# Altium schematic symbol library SCHLIB.SchLib: 2608 symbols (part 10 of 20) (continued)
## R-0R-0402 (continued)
footprint JMP-0402
pins: 1, 2

## R-0R-0402 3 Pad
designator R?, comment 0R  Case Code (Imperial): 0402
RES SMD 0 OHM JUMPER 1/16W 0402; Manufacturer: Royal Electronic Factory; Manufacturer Part Number: 0402WGJ0000TCE; Resistance: 0mR; Max Power Dissipation: 63mW; Power Rating: 62.5mW; Tolerance: 5%; Voltage Rating: 50V; Temperature Coefficient: 200ppm/°C; Washability: OK; ComponentLink1URL: http://www.vishay.com/docs/20035/dcrcwe3.pdf; ComponentLink1Description: http://www.vishay.com/docs/20035/dcrcwe3.pdf; ComponentLink2URL: http://www.farnell.com/datasheets/2111203.pdf; ComponentLink2Description: http://www.farnell.com/datasheets/2111203.pdf; ComponentLink3URL: http://www.farnell.com/datasheets/2045673.pdf; ComponentLink3Description: http://www.farnell.com/datasheets/2045673.pdf; ComponentLink4URL: https://www.distrelec.biz/Web/Downloads/a_/en/flD-CRCW-e3_data_en.pdf?mime=application%2Fpdf; ComponentLink4Description: https://www.distrelec.biz/Web/Downloads/a_/en/flD-CRCW-e3_data_en.pdf?mime=application%2Fpdf; ComponentLink5URL: http://datasheet.octopart.com/CRCW04020000Z0ED-Vishay-datasheet-14722531.pdf; ComponentLink5Description: http://datasheet.octopart.com/CRCW04020000Z0ED-Vishay-datasheet-14722531.pdf; ComponentLink6URL: http://datasheet.octopart.com/CRCW04020000Z0ED-Vishay-datasheet-83961561.pdf; ComponentLink6Description: http://datasheet.octopart.com/CRCW04020000Z0ED-Vishay-datasheet-83961561.pdf; ComponentLink7URL: http://datasheet.octopart.com/CRCW04020000Z0ED-Vishay-datasheet-16179825.pdf; ComponentLink7Description: http://datasheet.octopart.com/CRCW04020000Z0ED-Vishay-datasheet-16179825.pdf; ComponentLink8URL: http://datasheet.octopart.com/CRCW04020000Z0ED-Vishay-datasheet-62317933.pdf; ComponentLink8Description: http://datasheet.octopart.com/CRCW04020000Z0ED-Vishay-datasheet-62317933.pdf; ComponentLink9URL: http://datasheet.octopart.com/CRCW04020000Z0ED-Vishay-datasheet-5300368.pdf; ComponentLink9Description: http://datasheet.octopart.com/CRCW04020000Z0ED-Vishay-datasheet-5300368.pdf; ComponentLink10URL: http://datasheet.octopart.com/CRCW04020000Z0ED-Vishay-datasheet-5306405.pdf; ComponentLink10Description: http://datasheet.octopart.com/CRCW04020000Z0ED-Vishay-datasheet-5306405.pdf; ComponentLink11URL: http://datasheet.octopart.com/CRCW04020000Z0ED-Vishay-datasheet-11516975.pdf; ComponentLink11Description: http://datasheet.octopart.com/CRCW04020000Z0ED-Vishay-datasheet-11516975.pdf; ComponentLink12URL: http://datasheet.octopart.com/CRCW04020000Z0ED-Vishay-datasheet-17599201.pdf; ComponentLink12Description: http://datasheet.octopart.com/CRCW04020000Z0ED-Vishay-datasheet-17599201.pdf; ComponentLink13URL: http://datasheet.octopart.com/CRCW04020000Z0ED-Vishay-datasheet-41302739.pdf; ComponentLink13Description: http://datasheet.octopart.com/CRCW04020000Z0ED-Vishay-datasheet-41302739.pdf; ComponentLink14URL: http://datasheet.octopart.com/CRCW04020000Z0ED-Vishay-datasheet-27121962.pdf; ComponentLink14Description: http://datasheet.octopart.com/CRCW04020000Z0ED-Vishay-datasheet-27121962.pdf; ComponentLink15URL: http://datasheet.octopart.com/CRCW04020000Z0ED-Vishay-datasheet-66077789.pdf; ComponentLink15Description: http://datasheet.octopart.com/CRCW04020000Z0ED-Vishay-datasheet-66077789.pdf; ComponentLink16URL: http://datasheet.octopart.com/CRCW04020000Z0ED-Vishay-datasheet-42367.pdf; ComponentLink16Description: http://datasheet.octopart.com/CRCW04020000Z0ED-Vishay-datasheet-42367.pdf; ComponentLink17URL: http://datasheet.octopart.com/CRCW04020000Z0ED-Vishay-datasheet-148188.pdf; ComponentLink17Description: http://datasheet.octopart.com/CRCW04020000Z0ED-Vishay-datasheet-148188.pdf; ComponentLink18URL: http://datasheet.octopart.com/CRCW04020000Z0ED-Vishay-datasheet-5377255.pdf; ComponentLink18Description: http://datasheet.octopart.com/CRCW04020000Z0ED-Vishay-datasheet-5377255.pdf; ComponentLink19URL: http://datasheet.octopart.com/CRCW04020000Z0ED-Vishay-datasheet-8619608.pdf; ComponentLink19Description: http://datasheet.octopart.com/CRCW04020000Z0ED-Vishay-datasheet-8619608.pdf; ComponentLink20URL: http://datasheet.octopart.com/CRCW04020000Z0ED-Vishay-datasheet-11540273.pdf; ComponentLink20Description: http://datasheet.octopart.com/CRCW04020000Z0ED-Vishay-datasheet-11540273.pdf; ComponentLink21URL: http://datasheet.octopart.com/CRCW04020000Z0ED-Vishay-datasheet-12001583.pdf; ComponentLink21Description: http://datasheet.octopart.com/CRCW04020000Z0ED-Vishay-datasheet-12001583.pdf; ComponentLink22URL: http://datasheet.octopart.com/CRCW04020000Z0ED-Vishay-datasheet-546287.pdf; ComponentLink22Description: http://datasheet.octopart.com/CRCW04020000Z0ED-Vishay-datasheet-546287.pdf; ComponentLink23URL: http://datasheet.octopart.com/CRCW04020000Z0ED-Vishay-datasheet-8361388.pdf; ComponentLink23Description: http://datasheet.octopart.com/CRCW04020000Z0ED-Vishay-datasheet-8361388.pdf; ComponentLink24URL: http://datasheet.octopart.com/CRCW04020000Z0ED-Vishay-datasheet-8788789.pdf; ComponentLink24Description: http://datasheet.octopart.com/CRCW04020000Z0ED-Vishay-datasheet-8788789.pdf; ComponentLink25URL: http://datasheet.octopart.com/CRCW04020000Z0ED-Vishay-datasheet-10322335.pdf; ComponentLink25Description: http://datasheet.octopart.com/CRCW04020000Z0ED-Vishay-datasheet-10322335.pdf; ComponentLink26URL: http://datasheet.octopart.com/CRCW04020000Z0ED-Vishay-datasheet-12509762.pdf; ComponentLink26Description: http://datasheet.octopart.com/CRCW04020000Z0ED-Vishay-datasheet-12509762.pdf; ComponentLink27URL: http://datasheet.octopart.com/CRCW04020000Z0ED-Vishay-datasheet-12517896.pdf; ComponentLink27Description: http://datasheet.octopart.com/CRCW04020000Z0ED-Vishay-datasheet-12517896.pdf; ComponentLink28URL: http://datasheet.octopart.com/CRCW04020000Z0ED-Vishay-datasheet-12532161.pdf; ComponentLink28Description: http://datasheet.octopart.com/CRCW04020000Z0ED-Vishay-datasheet-12532161.pdf; ComponentLink29URL: http://datasheet.octopart.com/CRCW04020000Z0ED-Vishay-datasheet-12600034.pdf; ComponentLink29Description: http://datasheet.octopart.com/CRCW04020000Z0ED-Vishay-datasheet-12600034.pdf; ComponentLink30URL: http://datasheet.octopart.com/CRCW04020000Z0ED-Vishay-datasheet-13034211.pdf; ComponentLink30Description: http://datasheet.octopart.com/CRCW04020000Z0ED-Vishay-datasheet-13034211.pdf; ComponentLink31URL: http://datasheet.octopart.com/CRCW04020000Z0ED-Vishay-datasheet-13195083.pdf; ComponentLink31Description: http://datasheet.octopart.com/CRCW04020000Z0ED-Vishay-datasheet-13195083.pdf; ComponentLink32URL: http://datasheet.octopart.com/CRCW04020000Z0ED-Vishay-datasheet-13242068.pdf; ComponentLink32Description: http://datasheet.octopart.com/CRCW04020000Z0ED-Vishay-datasheet-13242068.pdf; ComponentLink33URL: http://datasheet.octopart.com/CRCW04020000Z0ED-Vishay-datasheet-14190200.pdf; ComponentLink33Description: http://datasheet.octopart.com/CRCW04020000Z0ED-Vishay-datasheet-14190200.pdf; ComponentLink34URL: http://datasheet.octopart.com/CRCW04020000Z0ED-Vishay-Dale-datasheet-38056517.pdf; ComponentLink34Description: http://datasheet.octopart.com/CRCW04020000Z0ED-Vishay-Dale-datasheet-38056517.pdf; ComponentLink35URL: http://datasheet.octopart.com/CRCW04020000Z0ED-Vishay-Dale-datasheet-47688880.pdf; ComponentLink35Description: http://datasheet.octopart.com/CRCW04020000Z0ED-Vishay-Dale-datasheet-47688880.pdf; ComponentLink36URL: http://datasheet.octopart.com/D-CRCW-e3-Standard-Thick-Film-Chip-Resistors-Vishay-datasheet-family-64.pdf; ComponentLink36Description: http://datasheet.octopart.com/D-CRCW-e3-Standard-Thick-Film-Chip-Resistors-Vishay-datasheet-family-64.pdf; Stock 1: 3532500; Pricing 1: 100=0.0089, 1000=0.0025, 10000=0.0013, 50000=0.00115, 250000=0.00105 (USD); Stock 2: 29923308; Pricing 2: 1=0.1, 10=0.014, 25=0.01, 50=0.0078, 100=0.0057, 250=0.00436, 500=0.00348, 1000=0.00257, 5000=0.00184 (USD); Case/Package: 0402; Case Code (Metric): 1005; Contact Plating: Matte,Tin; Min Operating Temperature: -55°C; Max Operating Temperature: 155°C; Packaging: Tape and Reel; Composition: Thick Film; Package Quantity: 1; Number of Terminations: 2; Termination: SMD/SMT; Features: Moisture Resistant; Military Standard: Not; Length: 1mm; Height: 0.016inch; Width: 0.02inch; Depth: 0.5mm; Radiation Hardening: No; Lead Free: Lead Free; REACH SVHC: Unknown; ComponentLink37URL: http://www.yageo.com/documents/recent/PYu-RC_Group_51_RoHS_L_9.pdf; ComponentLink37Description: http://www.yageo.com/documents/recent/PYu-RC_Group_51_RoHS_L_9.pdf; ComponentLink38URL: http://www.yageo.com/documents/recent/PYu-RC0402_51_RoHS_L_6.pdf; ComponentLink38Description: http://www.yageo.com/documents/recent/PYu-RC0402_51_RoHS_L_6.pdf; ComponentLink39URL: http://www.farnell.com/datasheets/1018594.pdf; ComponentLink39Description: http://www.farnell.com/datasheets/1018594.pdf; ComponentLink40URL: https://www.verical.com/server-webapp/html/getDatasheet?partID=326379; ComponentLink40Description: https://www.verical.com/server-webapp/html/getDatasheet?partID=326379; ComponentLink41URL: http://www.farnell.com/datasheets/2167052.pdf; ComponentLink41Description: http://www.farnell.com/datasheets/2167052.pdf; Mount: Surface Mount; Weight: 2.3E-05oz; Voltage Rating (DC): 50V; Stock 3: 70631880; Pricing 3: 1=0.1, 10=0.03, 25=0.0216, 50=0.0164, 100=0.0121, 250=0.00924, 500=0.0074, 1000=0.00545, 5000=0.00391 (USD); ComponentLink42URL: http://industrial.panasonic.com/www-data/pdf/AOA0000/AOA0000CE1.pdf; ComponentLink42Description: http://industrial.panasonic.com/www-data/pdf/AOA0000/AOA0000CE1.pdf; ComponentLink43URL: http://www.alliedelec.com/m/d/51cd0790071e1666bdb9d00c57fcf960.pdf; ComponentLink43Description: http://www.alliedelec.com/m/d/51cd0790071e1666bdb9d00c57fcf960.pdf; ComponentLink44URL: http://www.farnell.com/datasheets/2059623.pdf; ComponentLink44Description: http://www.farnell.com/datasheets/2059623.pdf; ComponentLink45URL: http://www.farnell.com/datasheets/1678796.pdf; ComponentLink45Description: http://www.farnell.com/datasheets/1678796.pdf; Supplier 1: Digi-Key; Supplier Part Number 1: 311-0.0JRDKR-ND
footprint R-0402 - 3 Pad
pins: 1, 2, 3

## R-0R-0603
designator R?, comment 0R  Case Code (Imperial): 0603
RES SMD 0 OHM 1/10W JUMP 0603; Manufacturer: Yageo; Manufacturer Part Number: RC0603JR-070RL; Resistance: 0mR; Tolerance: 1%; Power Rating: 100mW; Voltage Rating (DC): 50V; Temperature Coefficient: 200ppm/°C; Current Rating: 1A; Working Voltage: 75V; Washability: OK; Stock 1: 54397731; Pricing 1: 1=0.1, 10=0.021, 25=0.0152, 50=0.0114, 100=0.0084, 250=0.00644, 500=0.00514, 1000=0.00379 (USD); Case/Package: 0603; Number of Pins: 2; Contact Plating: Matte,Tin; Case Code (Metric): 1608; Min Operating Temperature: -55°C; Max Operating Temperature: 155°C; Composition: Thick Film; Packaging: Tape and Reel; Termination: SMD/SMT; Package Quantity: 5000; Voltage Rating: 50V; Military Standard: Not; Length: 1.6mm; Height: 0.45mm; Width: 0.8mm; Depth: 0.8mm; Radiation Hardening: No; REACH SVHC: No SVHC; Lead Free: Lead Free; ComponentLink1URL: http://www.farnell.com/datasheets/1738695.pdf; ComponentLink1Description: http://www.farnell.com/datasheets/1738695.pdf; ComponentLink2URL: https://www.verical.com/server-webapp/html/getDatasheet?partID=329462; ComponentLink2Description: https://www.verical.com/server-webapp/html/getDatasheet?partID=329462; ComponentLink3URL: http://www.yageo.com/documents/recent/PYu-RC_Group_51_RoHS_L_9.pdf; ComponentLink3Description: http://www.yageo.com/documents/recent/PYu-RC_Group_51_RoHS_L_9.pdf; ComponentLink4URL: http://www.farnell.com/datasheets/443971.pdf; ComponentLink4Description: http://www.farnell.com/datasheets/443971.pdf; ComponentLink5URL: http://documents.rs-components.com/techlib://itc_doclist_GB.htm?stockno=6515918; ComponentLink5Description: http://documents.rs-components.com/techlib://itc_doclist_GB.htm?stockno=6515918; Stock 2: 6104331; Pricing 2: 1=0.1, 10=0.021, 25=0.0152, 50=0.0114, 100=0.0084, 250=0.00644, 500=0.00514, 1000=0.00379 (USD); Number of Terminations: 2; Max Power Dissipation: 100mW; Features: Moisture Resistant; ComponentLink6URL: http://www.farnell.com/datasheets/1868787.pdf; ComponentLink6Description: http://www.farnell.com/datasheets/1868787.pdf; ComponentLink7URL: http://documents.rs-components.com/techlib://itc_doclist_GB.htm?stockno=5048827; ComponentLink7Description: http://documents.rs-components.com/techlib://itc_doclist_GB.htm?stockno=5048827; Stock 3: 34178498; Pricing 3: 1=0.1, 10=0.042, 25=0.0304, 50=0.0232, 100=0.0171, 250=0.01308, 500=0.01046, 1000=0.0077 (USD); Mount: Surface Mount; ComponentLink8URL: http://industrial.panasonic.com/www-data/pdf/AOA0000/AOA0000CE1.pdf; ComponentLink8Description: http://industrial.panasonic.com/www-data/pdf/AOA0000/AOA0000CE1.pdf; ComponentLink9URL: http://www.farnell.com/datasheets/2059623.pdf; ComponentLink9Description: http://www.farnell.com/datasheets/2059623.pdf; ComponentLink10URL: http://www.jameco.com/Jameco/Products/ProdDS/1935748.pdf; ComponentLink10Description: http://www.jameco.com/Jameco/Products/ProdDS/1935748.pdf; ComponentLink11URL: http://www.farnell.com/datasheets/1678796.pdf; ComponentLink11Description: http://www.farnell.com/datasheets/1678796.pdf; ComponentLink12URL: http://www.alliedelec.com/m/d/51cd0790071e1666bdb9d00c57fcf960.pdf; ComponentLink12Description: http://www.alliedelec.com/m/d/51cd0790071e1666bdb9d00c57fcf960.pdf; Supplier 1: Digi-Key; Supplier Part Number 1: 311-0.0HRDKR-ND
footprint JMP-0603
pins: 1, 2

## R-0R-0603 3 Pad
designator R?, comment 0R  Case Code (Imperial): 0603
RES SMD 0 OHM 1/10W JUMP 0603; Manufacturer: Yageo; Manufacturer Part Number: RC0603JR-070RL; Resistance: 0mR; Tolerance: 1%; Power Rating: 100mW; Voltage Rating (DC): 50V; Temperature Coefficient: 200ppm/°C; Current Rating: 1A; Working Voltage: 75V; Washability: OK; Stock 1: 54397731; Pricing 1: 1=0.1, 10=0.021, 25=0.0152, 50=0.0114, 100=0.0084, 250=0.00644, 500=0.00514, 1000=0.00379 (USD); Case/Package: 0603; Number of Pins: 2; Contact Plating: Matte,Tin; Case Code (Metric): 1608; Min Operating Temperature: -55°C; Max Operating Temperature: 155°C; Composition: Thick Film; Packaging: Tape and Reel; Termination: SMD/SMT; Package Quantity: 5000; Voltage Rating: 50V; Military Standard: Not; Length: 1.6mm; Height: 0.45mm; Width: 0.8mm; Depth: 0.8mm; Radiation Hardening: No; REACH SVHC: No SVHC; Lead Free: Lead Free; ComponentLink1URL: http://www.farnell.com/datasheets/1738695.pdf; ComponentLink1Description: http://www.farnell.com/datasheets/1738695.pdf; ComponentLink2URL: https://www.verical.com/server-webapp/html/getDatasheet?partID=329462; ComponentLink2Description: https://www.verical.com/server-webapp/html/getDatasheet?partID=329462; ComponentLink3URL: http://www.yageo.com/documents/recent/PYu-RC_Group_51_RoHS_L_9.pdf; ComponentLink3Description: http://www.yageo.com/documents/recent/PYu-RC_Group_51_RoHS_L_9.pdf; ComponentLink4URL: http://www.farnell.com/datasheets/443971.pdf; ComponentLink4Description: http://www.farnell.com/datasheets/443971.pdf; ComponentLink5URL: http://documents.rs-components.com/techlib://itc_doclist_GB.htm?stockno=6515918; ComponentLink5Description: http://documents.rs-components.com/techlib://itc_doclist_GB.htm?stockno=6515918; Stock 2: 6104331; Pricing 2: 1=0.1, 10=0.021, 25=0.0152, 50=0.0114, 100=0.0084, 250=0.00644, 500=0.00514, 1000=0.00379 (USD); Number of Terminations: 2; Max Power Dissipation: 100mW; Features: Moisture Resistant; ComponentLink6URL: http://www.farnell.com/datasheets/1868787.pdf; ComponentLink6Description: http://www.farnell.com/datasheets/1868787.pdf; ComponentLink7URL: http://documents.rs-components.com/techlib://itc_doclist_GB.htm?stockno=5048827; ComponentLink7Description: http://documents.rs-components.com/techlib://itc_doclist_GB.htm?stockno=5048827; Stock 3: 34178498; Pricing 3: 1=0.1, 10=0.042, 25=0.0304, 50=0.0232, 100=0.0171, 250=0.01308, 500=0.01046, 1000=0.0077 (USD); Mount: Surface Mount; ComponentLink8URL: http://industrial.panasonic.com/www-data/pdf/AOA0000/AOA0000CE1.pdf; ComponentLink8Description: http://industrial.panasonic.com/www-data/pdf/AOA0000/AOA0000CE1.pdf; ComponentLink9URL: http://www.farnell.com/datasheets/2059623.pdf; ComponentLink9Description: http://www.farnell.com/datasheets/2059623.pdf; ComponentLink10URL: http://www.jameco.com/Jameco/Products/ProdDS/1935748.pdf; ComponentLink10Description: http://www.jameco.com/Jameco/Products/ProdDS/1935748.pdf; ComponentLink11URL: http://www.farnell.com/datasheets/1678796.pdf; ComponentLink11Description: http://www.farnell.com/datasheets/1678796.pdf; ComponentLink12URL: http://www.alliedelec.com/m/d/51cd0790071e1666bdb9d00c57fcf960.pdf; ComponentLink12Description: http://www.alliedelec.com/m/d/51cd0790071e1666bdb9d00c57fcf960.pdf; Supplier 1: Digi-Key; Supplier Part Number 1: 311-0.0HRDKR-ND
footprint R-0603 - 3 Pad
pins: 1, 2, 3

## R-1.1K-0402
designator R?, comment Package: 0402  (hidden comment: 1.1K)
RES 1.1K OHM 1% 1/16W 0402; Manufacturer Part Number: RC0402FR-071K1L; Manufacturer: YAGEO; Tolerance: 0.01; Power: 0.063W; Temperature Coefficient: ±100ppm/°C; Object  Type: Part; Design Item ID: R-1.1K-0402; Value: 1.1K; Composition: Thick Film; Features: Moisture Resistant; Operating Temperature: -55°C ~ 155°C; Height - Seated (Max): 0.40mm; Category: Resistor
footprint R0402
pins: 1, 2

## R-1.1K-0603
designator R?, comment Package: 0603  (hidden comment: 1.1K)
RES SMD 1.1K OHM 1% 1/10W 0603; Manufacturer Part Number: CRCW06031K10FKEA; Manufacturer: Vishay Dale; Tolerance: 0.01; Power: 0.1W; Temperature Coefficient: ±100ppm/°C; Object  Type: Part; Design Item ID: R-1.1K-0603; Value: 1.1K; Composition: Thick Film; Features: Automotive AEC-Q200; Operating Temperature: -55°C ~ 155°C; Height - Seated (Max): 0.50mm; Category: Resistor
footprint R0603
pins: 1, 2

## R-1.1M-0402
designator R?, comment Package: 0402  (hidden comment: 1.1M)
RES 1.1M OHM 1% 1/16W 0402; Manufacturer Part Number: RC0402FR-071M1L; Manufacturer: YAGEO; Tolerance: 0.01; Power: 0.063W; Temperature Coefficient: ±100ppm/°C; Object  Type: Part; Design Item ID: R-1.1M-0402; Value: 1.1M; Composition: Thick Film; Features: Moisture Resistant; Operating Temperature: -55°C ~ 155°C; Height - Seated (Max): 0.40mm; Category: Resistor
footprint R0402
pins: 1, 2

## R-1.1M-0603
designator R?, comment Package: 0603  (hidden comment: 1.1M)
RES SMD 1.1M OHM 1% 1/10W 0603; Manufacturer Part Number: CRCW06031M10FKEA; Manufacturer: Vishay Dale; Tolerance: 0.01; Power: 0.1W; Temperature Coefficient: ±100ppm/°C; Object  Type: Part; Design Item ID: R-1.1M-0603; Value: 1.1M; Composition: Thick Film; Features: Automotive AEC-Q200; Operating Temperature: -55°C ~ 155°C; Height - Seated (Max): 0.50mm; Category: Resistor
footprint R0603
pins: 1, 2

## R-1.1R-0603
designator R?, comment Package: 0603  (hidden comment: 1.1R)
RES SMD 1.1 OHM 1% 1/10W 0603; Manufacturer Part Number: CRCW06031R10FKEA; Manufacturer: Vishay Dale; Tolerance: 0.01; Power: 0.1W; Temperature Coefficient: ±100ppm/°C; Object  Type: Part; Design Item ID: R-1.1R-0603; Value: 1.1R; Composition: Thick Film; Features: Automotive AEC-Q200; Operating Temperature: -55°C ~ 155°C; Height - Seated (Max): 0.50mm; Category: Resistor
footprint R0603
pins: 1, 2

## R-1.02K-0402
designator R?, comment Package: 0402  (hidden comment: 1.02K)
RES 1.02K OHM 1% 1/16W 0402; Manufacturer Part Number: RC0402FR-071K02L; Manufacturer: YAGEO; Tolerance: 0.01; Power: 0.063W; Temperature Coefficient: ±100ppm/°C; Object  Type: Part; Design Item ID: R-1.02K-0402; Value: 1.02K; Composition: Thick Film; Features: Moisture Resistant; Operating Temperature: -55°C ~ 155°C; Height - Seated (Max): 0.40mm; Category: Resistor
footprint R0402
pins: 1, 2

## R-1.2K-0402
designator R?, comment Package: 0402  (hidden comment: 1.2K)
RES 1.2K OHM 1% 1/16W 0402; Manufacturer Part Number: RC0402FR-071K2L; Manufacturer: YAGEO; Tolerance: 0.01; Power: 0.063W; Temperature Coefficient: ±100ppm/°C; Object  Type: Part; Design Item ID: R-1.2K-0402; Value: 1.2K; Composition: Thick Film; Features: Moisture Resistant; Operating Temperature: -55°C ~ 155°C; Height - Seated (Max): 0.40mm; Category: Resistor
footprint R0402
pins: 1, 2

## R-1.02K-0603
designator R?, comment Package: 0603  (hidden comment: 1.02K)
RES SMD 1.02K OHM 1% 1/10W 0603; Manufacturer Part Number: CRCW06031K02FKEA; Manufacturer: Vishay Dale; Tolerance: 0.01; Power: 0.1W; Temperature Coefficient: ±100ppm/°C; Object  Type: Part; Design Item ID: R-1.02K-0603; Value: 1.02K; Composition: Thick Film; Features: Automotive AEC-Q200; Operating Temperature: -55°C ~ 155°C; Height - Seated (Max): 0.50mm; Category: Resistor
footprint R0603
pins: 1, 2

## R-1.2K-0603
designator R?, comment Package: 0603  (hidden comment: 1.2K)
RES SMD 1.2K OHM 1% 1/10W 0603; Manufacturer Part Number: CRCW06031K20FKEA; Manufacturer: Vishay Dale; Tolerance: 0.01; Power: 0.1W; Temperature Coefficient: ±100ppm/°C; Object  Type: Part; Design Item ID: R-1.2K-0603; Value: 1.2K; Composition: Thick Film; Features: Automotive AEC-Q200; Operating Temperature: -55°C ~ 155°C; Height - Seated (Max): 0.50mm; Category: Resistor
footprint R0603
pins: 1, 2

## R-1.02M-0402
designator R?, comment Package: 0402  (hidden comment: 1.02M)
RES 1.02M OHM 1% 1/16W 0402; Manufacturer Part Number: RC0402FR-071M02L; Manufacturer: YAGEO; Tolerance: 0.01; Power: 0.063W; Temperature Coefficient: ±100ppm/°C; Object  Type: Part; Design Item ID: R-1.02M-0402; Value: 1.02M; Composition: Thick Film; Features: Moisture Resistant; Operating Temperature: -55°C ~ 155°C; Height - Seated (Max): 0.40mm; Category: Resistor
footprint R0402
pins: 1, 2

## R-1.2M-0402
designator R?, comment Package: 0402  (hidden comment: 1.2M)
RES 1.2M OHM 1% 1/16W 0402; Manufacturer Part Number: RC0402FR-071M2L; Manufacturer: YAGEO; Tolerance: 0.01; Power: 0.063W; Temperature Coefficient: ±100ppm/°C; Object  Type: Part; Design Item ID: R-1.2M-0402; Value: 1.2M; Composition: Thick Film; Features: Moisture Resistant; Operating Temperature: -55°C ~ 155°C; Height - Seated (Max): 0.40mm; Category: Resistor
footprint R0402
pins: 1, 2

## R-1.02M-0603
designator R?, comment Package: 0603  (hidden comment: 1.02M)
RES SMD 1.02M OHM 1% 1/10W 0603; Manufacturer Part Number: CRCW06031M02FKEA; Manufacturer: Vishay Dale; Tolerance: 0.01; Power: 0.1W; Temperature Coefficient: ±100ppm/°C; Object  Type: Part; Design Item ID: R-1.02M-0603; Value: 1.02M; Composition: Thick Film; Features: Automotive AEC-Q200; Operating Temperature: -55°C ~ 155°C; Height - Seated (Max): 0.50mm; Category: Resistor
footprint R0603
pins: 1, 2

## R-1.2M-0603
designator R?, comment Package: 0603  (hidden comment: 1.2M)
RES SMD 1.2M OHM 1% 1/10W 0603; Manufacturer Part Number: CRCW06031M20FKEA; Manufacturer: Vishay Dale; Tolerance: 0.01; Power: 0.1W; Temperature Coefficient: ±100ppm/°C; Object  Type: Part; Design Item ID: R-1.2M-0603; Value: 1.2M; Composition: Thick Film; Features: Automotive AEC-Q200; Operating Temperature: -55°C ~ 155°C; Height - Seated (Max): 0.50mm; Category: Resistor
footprint R0603
pins: 1, 2

## R-1.02R-0603
designator R?, comment Package: 0603  (hidden comment: 1.02R)
RES SMD 1.02 OHM 1% 1/10W 0603; Manufacturer Part Number: CRCW06031R02FKEA; Manufacturer: Vishay Dale; Tolerance: 0.01; Power: 0.1W; Temperature Coefficient: ±100ppm/°C; Object  Type: Part; Design Item ID: R-1.02R-0603; Value: 1.02R; Composition: Thick Film; Features: Automotive AEC-Q200; Operating Temperature: -55°C ~ 155°C; Height - Seated (Max): 0.50mm; Category: Resistor
footprint R0603
pins: 1, 2

## R-1.2R-0603
designator R?, comment Package: 0603  (hidden comment: 1.2R)
RES SMD 1.2 OHM 1% 1/10W 0603; Manufacturer Part Number: CRCW06031R20FKEA; Manufacturer: Vishay Dale; Tolerance: 0.01; Power: 0.1W; Temperature Coefficient: ±100ppm/°C; Object  Type: Part; Design Item ID: R-1.2R-0603; Value: 1.2R; Composition: Thick Film; Features: Automotive AEC-Q200; Operating Temperature: -55°C ~ 155°C; Height - Seated (Max): 0.50mm; Category: Resistor
footprint R0603
pins: 1, 2

## R-1.3K-0402
designator R?, comment Package: 0402  (hidden comment: 1.3K)
RES 1.3K OHM 1% 1/16W 0402; Manufacturer Part Number: RC0402FR-071K3L; Manufacturer: YAGEO; Tolerance: 0.01; Power: 0.063W; Temperature Coefficient: ±100ppm/°C; Object  Type: Part; Design Item ID: R-1.3K-0402; Value: 1.3K; Composition: Thick Film; Features: Moisture Resistant; Operating Temperature: -55°C ~ 155°C; Height - Seated (Max): 0.40mm; Category: Resistor
footprint R0402
pins: 1, 2

## R-1.3K-0603
designator R?, comment Package: 0603  (hidden comment: 1.3K)
RES SMD 1.3K OHM 1% 1/10W 0603; Manufacturer Part Number: CRCW06031K30FKEA; Manufacturer: Vishay Dale; Tolerance: 0.01; Power: 0.1W; Temperature Coefficient: ±100ppm/°C; Object  Type: Part; Design Item ID: R-1.3K-0603; Value: 1.3K; Composition: Thick Film; Features: Automotive AEC-Q200; Operating Temperature: -55°C ~ 155°C; Height - Seated (Max): 0.50mm; Category: Resistor
footprint R0603
pins: 1, 2

## R-1.3M-0402
designator R?, comment Package: 0402  (hidden comment: 1.3M)
RES 1.3M OHM 1% 1/16W 0402; Manufacturer Part Number: RC0402FR-071M3L; Manufacturer: YAGEO; Tolerance: 0.01; Power: 0.063W; Temperature Coefficient: ±100ppm/°C; Object  Type: Part; Design Item ID: R-1.3M-0402; Value: 1.3M; Composition: Thick Film; Features: Moisture Resistant; Operating Temperature: -55°C ~ 155°C; Height - Seated (Max): 0.40mm; Category: Resistor
footprint R0402
pins: 1, 2

## R-1.3M-0603
designator R?, comment Package: 0603  (hidden comment: 1.3M)
RES SMD 1.3M OHM 1% 1/10W 0603; Manufacturer Part Number: CRCW06031M30FKEA; Manufacturer: Vishay Dale; Tolerance: 0.01; Power: 0.1W; Temperature Coefficient: ±100ppm/°C; Object  Type: Part; Design Item ID: R-1.3M-0603; Value: 1.3M; Composition: Thick Film; Features: Automotive AEC-Q200; Operating Temperature: -55°C ~ 155°C; Height - Seated (Max): 0.50mm; Category: Resistor
footprint R0603
pins: 1, 2

## R-1.3R-0603
designator R?, comment Package: 0603  (hidden comment: 1.3R)
RES SMD 1.3 OHM 1% 1/10W 0603; Manufacturer Part Number: CRCW06031R30FKEA; Manufacturer: Vishay Dale; Tolerance: 0.01; Power: 0.1W; Temperature Coefficient: ±100ppm/°C; Object  Type: Part; Design Item ID: R-1.3R-0603; Value: 1.3R; Composition: Thick Film; Features: Automotive AEC-Q200; Operating Temperature: -55°C ~ 155°C; Height - Seated (Max): 0.50mm; Category: Resistor
footprint R0603
pins: 1, 2

## R-1.4K-0402
designator R?, comment Package: 0402  (hidden comment: 1.4K)
RES 1.4K OHM 1% 1/16W 0402; Manufacturer Part Number: RC0402FR-071K4L; Manufacturer: YAGEO; Tolerance: 0.01; Power: 0.063W; Temperature Coefficient: ±100ppm/°C; Object  Type: Part; Design Item ID: R-1.4K-0402; Value: 1.4K; Composition: Thick Film; Features: Moisture Resistant; Operating Temperature: -55°C ~ 155°C; Height - Seated (Max): 0.40mm; Category: Resistor
footprint R0402
pins: 1, 2

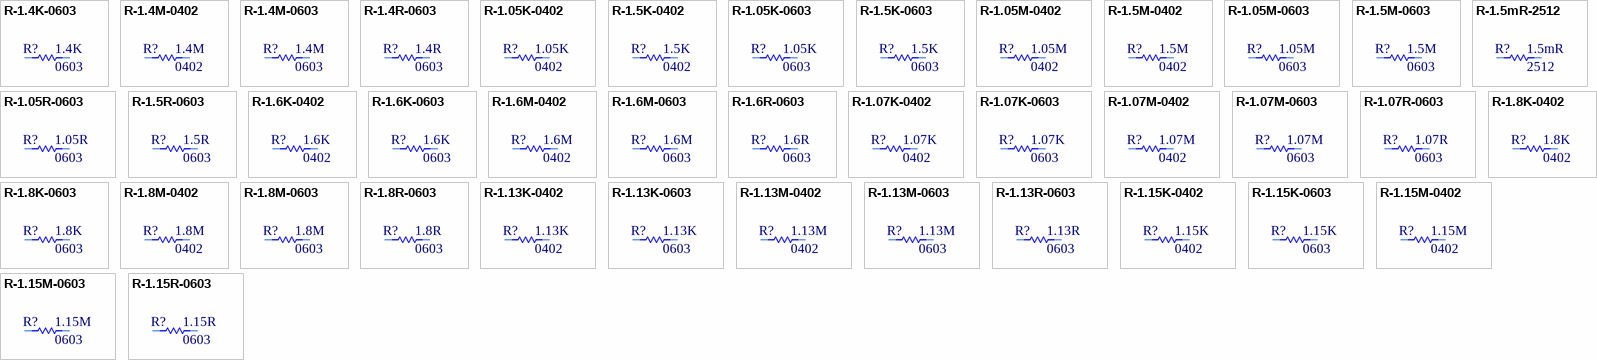
[diagram p44: symbols R-1.4K-0603 to R-1.15R-0603]

## R-1.4K-0603
designator R?, comment Package: 0603  (hidden comment: 1.4K)
RES SMD 1.4K OHM 1% 1/10W 0603; Manufacturer Part Number: CRCW06031K40FKEA; Manufacturer: Vishay Dale; Tolerance: 0.01; Power: 0.1W; Temperature Coefficient: ±100ppm/°C; Object  Type: Part; Design Item ID: R-1.4K-0603; Value: 1.4K; Composition: Thick Film; Features: Automotive AEC-Q200; Operating Temperature: -55°C ~ 155°C; Height - Seated (Max): 0.50mm; Category: Resistor
footprint R0603
pins: 1, 2

## R-1.4M-0402
designator R?, comment Package: 0402  (hidden comment: 1.4M)
RES 1.4M OHM 1% 1/16W 0402; Manufacturer Part Number: RC0402FR-071M4L; Manufacturer: YAGEO; Tolerance: 0.01; Power: 0.063W; Temperature Coefficient: ±100ppm/°C; Object  Type: Part; Design Item ID: R-1.4M-0402; Value: 1.4M; Composition: Thick Film; Features: Moisture Resistant; Operating Temperature: -55°C ~ 155°C; Height - Seated (Max): 0.40mm; Category: Resistor
footprint R0402
pins: 1, 2

## R-1.4M-0603
designator R?, comment Package: 0603  (hidden comment: 1.4M)
RES SMD 1.4M OHM 1% 1/10W 0603; Manufacturer Part Number: CRCW06031M40FKEA; Manufacturer: Vishay Dale; Tolerance: 0.01; Power: 0.1W; Temperature Coefficient: ±100ppm/°C; Object  Type: Part; Design Item ID: R-1.4M-0603; Value: 1.4M; Composition: Thick Film; Features: Automotive AEC-Q200; Operating Temperature: -55°C ~ 155°C; Height - Seated (Max): 0.50mm; Category: Resistor
footprint R0603
pins: 1, 2

## R-1.4R-0603
designator R?, comment Package: 0603  (hidden comment: 1.4R)
RES SMD 1.4 OHM 1% 1/10W 0603; Manufacturer Part Number: CRCW06031R40FKEA; Manufacturer: Vishay Dale; Tolerance: 0.01; Power: 0.1W; Temperature Coefficient: ±100ppm/°C; Object  Type: Part; Design Item ID: R-1.4R-0603; Value: 1.4R; Composition: Thick Film; Features: Automotive AEC-Q200; Operating Temperature: -55°C ~ 155°C; Height - Seated (Max): 0.50mm; Category: Resistor
footprint R0603
pins: 1, 2

## R-1.05K-0402
designator R?, comment Package: 0402  (hidden comment: 1.05K)
RES 1.05K OHM 1% 1/16W 0402; Manufacturer Part Number: RC0402FR-071K05L; Manufacturer: YAGEO; Tolerance: 0.01; Power: 0.063W; Temperature Coefficient: ±100ppm/°C; Object  Type: Part; Design Item ID: R-1.05K-0402; Value: 1.05K; Composition: Thick Film; Features: Moisture Resistant; Operating Temperature: -55°C ~ 155°C; Height - Seated (Max): 0.40mm; Category: Resistor
footprint R0402
pins: 1, 2

## R-1.5K-0402
designator R?, comment Package: 0402  (hidden comment: 1.5K)
RES 1.5K OHM 1% 1/16W 0402; Manufacturer Part Number: RC0402FR-071K5L; Manufacturer: YAGEO; Tolerance: 0.01; Power: 0.063W; Temperature Coefficient: ±100ppm/°C; Object  Type: Part; Design Item ID: R-1.5K-0402; Value: 1.5K; Composition: Thick Film; Features: Moisture Resistant; Operating Temperature: -55°C ~ 155°C; Height - Seated (Max): 0.40mm; Category: Resistor
footprint R0402
pins: 1, 2

## R-1.05K-0603
designator R?, comment Package: 0603  (hidden comment: 1.05K)
RES SMD 1.05K OHM 1% 1/10W 0603; Manufacturer Part Number: CRCW06031K05FKEA; Manufacturer: Vishay Dale; Tolerance: 0.01; Power: 0.1W; Temperature Coefficient: ±100ppm/°C; Object  Type: Part; Design Item ID: R-1.05K-0603; Value: 1.05K; Composition: Thick Film; Features: Automotive AEC-Q200; Operating Temperature: -55°C ~ 155°C; Height - Seated (Max): 0.50mm; Category: Resistor
footprint R0603
pins: 1, 2

## R-1.5K-0603
designator R?, comment Package: 0603  (hidden comment: 1.5K)
RES SMD 1.5K OHM 1% 1/10W 0603; Manufacturer Part Number: CRCW06031K50FKEA; Manufacturer: Vishay Dale; Tolerance: 0.01; Power: 0.1W; Temperature Coefficient: ±100ppm/°C; Object  Type: Part; Design Item ID: R-1.5K-0603; Value: 1.5K; Composition: Thick Film; Features: Automotive AEC-Q200; Operating Temperature: -55°C ~ 155°C; Height - Seated (Max): 0.50mm; Category: Resistor
footprint R0603
pins: 1, 2

## R-1.05M-0402
designator R?, comment Package: 0402  (hidden comment: 1.05M)
RES 1.05M OHM 1% 1/16W 0402; Manufacturer Part Number: RC0402FR-071M05L; Manufacturer: YAGEO; Tolerance: 0.01; Power: 0.063W; Temperature Coefficient: ±100ppm/°C; Object  Type: Part; Design Item ID: R-1.05M-0402; Value: 1.05M; Composition: Thick Film; Features: Moisture Resistant; Operating Temperature: -55°C ~ 155°C; Height - Seated (Max): 0.40mm; Category: Resistor
footprint R0402
pins: 1, 2

## R-1.5M-0402
designator R?, comment Package: 0402  (hidden comment: 1.5M)
RES 1.5M OHM 1% 1/16W 0402; Manufacturer Part Number: RC0402FR-071M5L; Manufacturer: YAGEO; Tolerance: 0.01; Power: 0.063W; Temperature Coefficient: ±100ppm/°C; Object  Type: Part; Design Item ID: R-1.5M-0402; Value: 1.5M; Composition: Thick Film; Features: Moisture Resistant; Operating Temperature: -55°C ~ 155°C; Height - Seated (Max): 0.40mm; Category: Resistor
footprint R0402
pins: 1, 2